# Altium footprint library LimeMicroAltiumLib_pcbLib_r01.PcbLib: 434 footprints (part 5 of 29)
Each footprint in its own frame and in the unit in brackets; x right, y up, seen from the top. Pads: shape width x height; smd on the part's side, far side on the other; paste and mask are expansions set on the pad; w line width, h text height; cw(c..) or ccw(c..) is an arc to the next point about the centre after c.
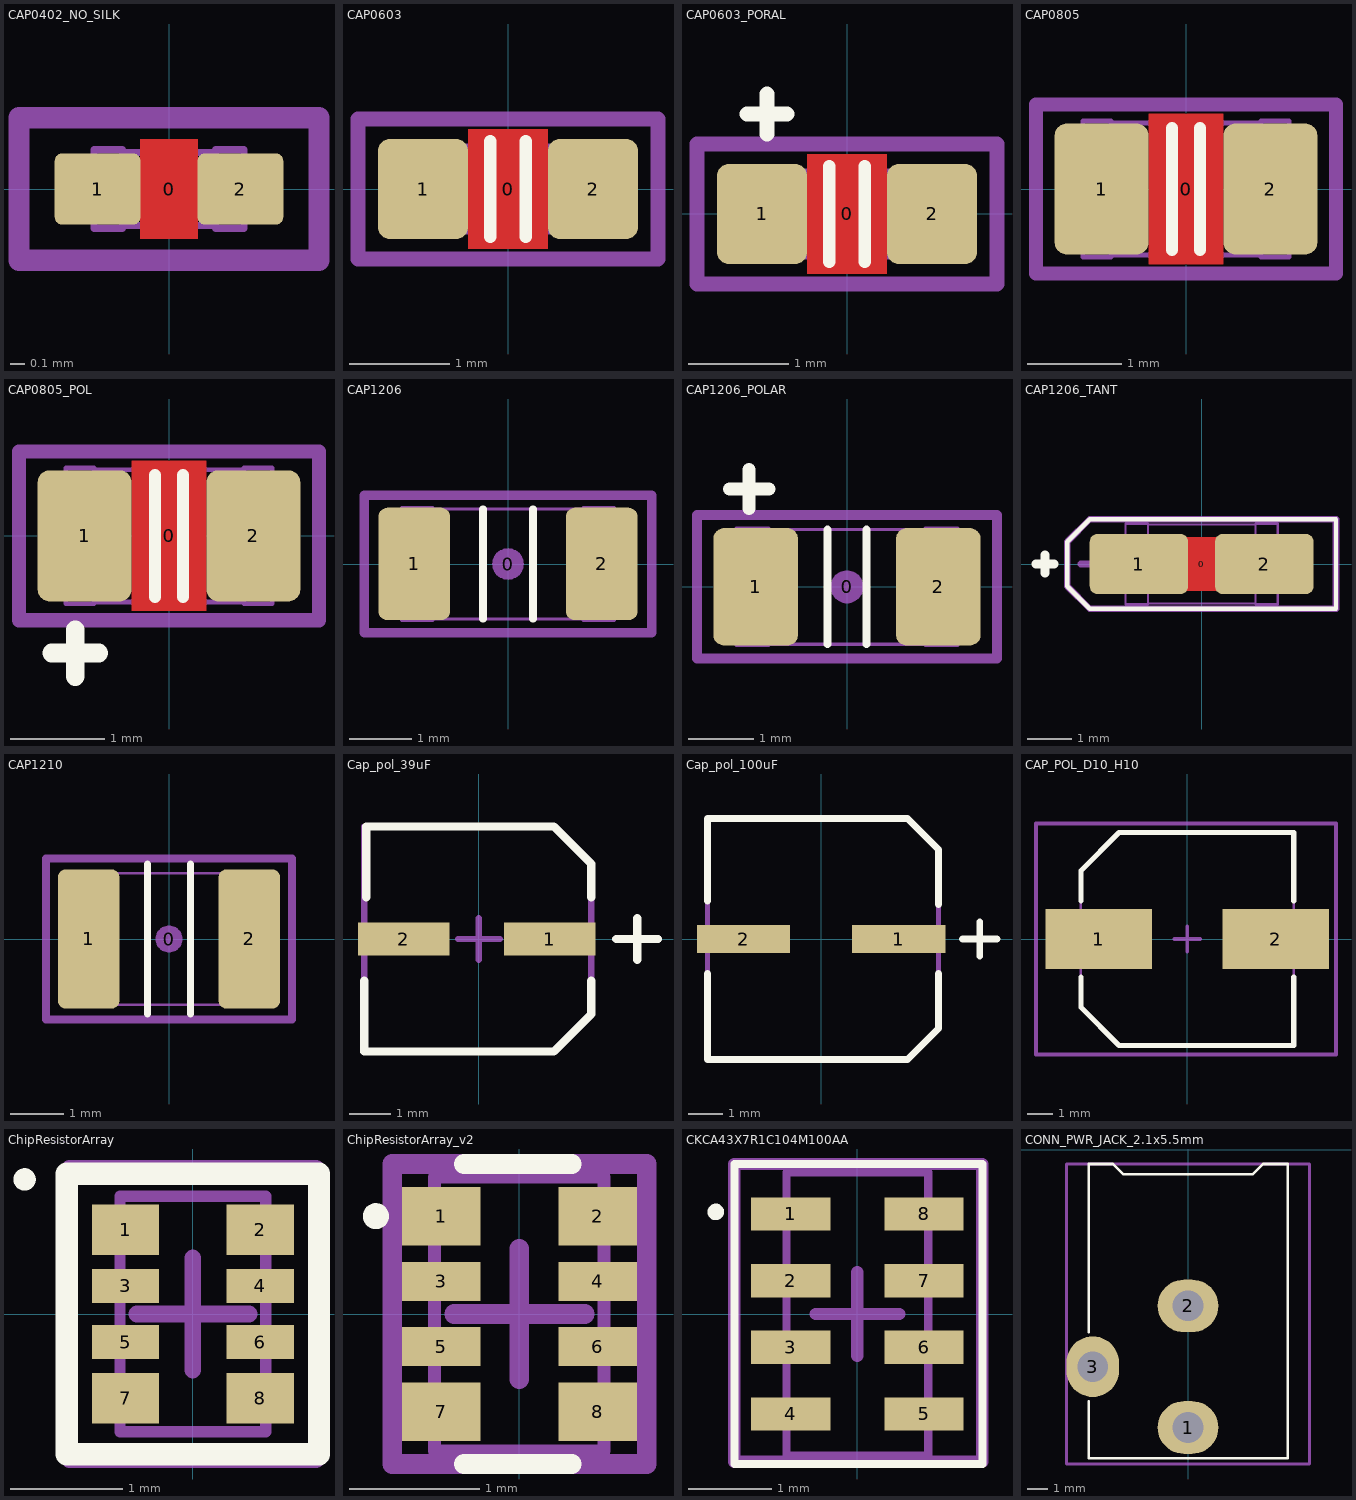
[diagram p4: the footprints below, top view; thin cyan lines are the x and y axes]

## CAP0402_NO_SILK [mm] "Chip Capacitor, Body 1.0x0.5mm, 0402, IPC Medium Density"
height 0.55
pads (3):
  round 0.2 on Mech15: 0(0,0)
  rrect20% 0.6x0.5 smd: 1(-0.5,0) 2(0.5,0)
Top Layer:
  pour cut-out: -0.2,0.35 0.2,0.35 0.2,-0.35 -0.2,-0.35
Mechanical 13:
  lines w0.05: -0.325,-0.255 0.325,-0.255 ; -0.325,0.255 0.325,0.255 ; -0.525,-0.275 -0.525,0.275 -0.325,0.275 -0.325,-0.275 -0.525,-0.275 ; 0.325,-0.275 0.525,-0.275 0.525,0.275 0.325,0.275 0.325,-0.275
Mechanical 15:
  lines w0.15: -1.05,-0.5 -1.05,0.5 1.05,0.5 1.05,-0.5 -1.05,-0.5
  text ".Designator" at 0,0 h0.55
3D body "CAP 0402 (1005 metric).STEP": height 0.55, standoff 0, extent -0.525,-0.275 0.525,0.275

## CAP0603 [mm] "Chip Capacitor, Body 1.6x0.8mm, 0603, IPC Medium Density"
height 0.8
pads (3):
  round 0.254 on Mech15: 0(0,0)
  rrect25% 0.9x1 smd: 1(-0.85,0) 2(0.85,0)
Top Layer:
  pour cut-out: -0.4,0.6 0.4,0.6 0.4,-0.6 -0.4,-0.6
Top Overlay:
  lines w0.127: -0.178,-0.476 -0.178,0.476 ; 0.178,-0.476 0.178,0.476
Mechanical 13:
  lines w0.05: -0.55,-0.43 0.55,-0.43 ; -0.55,0.43 0.55,0.43 ; -0.85,-0.45 -0.85,0.45 -0.55,0.45 -0.55,-0.45 -0.85,-0.45 ; 0.55,-0.45 0.55,0.45 0.85,0.45 0.85,-0.45 0.55,-0.45
Mechanical 15:
  lines w0.15: -1.5,-0.7 -1.5,0.7 1.5,0.7 1.5,-0.7 -1.5,-0.7
  text ".Designator" at 0,0 h0.55
3D body "CAP_0603.STEP": height 0.89, standoff -0.01, extent -0.85,-0.45 0.85,0.45

## CAP0603_PORAL [mm] "Chip Capacitor, Body 1.6x0.8mm, 0603, IPC Medium Density"
height 0.8
pads (3):
  round 0.254 on Mech15: 0(0,0)
  rrect25% 0.9x1 smd: 1(-0.85,0) 2(0.85,0)
Top Layer:
  pour cut-out: -0.4,0.6 0.4,0.6 0.4,-0.6 -0.4,-0.6
Top Overlay:
  lines w0.127: -0.178,-0.476 -0.178,0.476 ; 0.178,-0.476 0.178,0.476
  lines w0.15: -1,1 -0.6,1 ; -0.8,0.8 -0.8,1.2
Mechanical 13:
  lines w0.05: -0.55,-0.43 0.55,-0.43 ; -0.55,0.43 0.55,0.43 ; -0.85,-0.45 -0.85,0.45 -0.55,0.45 -0.55,-0.45 -0.85,-0.45 ; 0.55,-0.45 0.55,0.45 0.85,0.45 0.85,-0.45 0.55,-0.45
Mechanical 15:
  lines w0.15: -1.1,0 -0.7,0 ; -0.9,-0.2 -0.9,0.2 ; -1.5,-0.7 -1.5,0.7 1.5,0.7 1.5,-0.7 -1.5,-0.7
  text "Anode" at -1.4,-0.6 h0.3
  text ".Designator" at 0,0 h0.55
3D body "CAP_0603.STEP": height 0.89, standoff -0.01, extent -0.85,-0.45 0.85,0.45

## CAP0805 [mm] "Chip Capacitor, Body 2.0x1.2mm, 0805, IPC Medium Density"
height 1.2
pads (3):
  round 0.254 on Mech15: 0(0,0)
  rrect25% 1x1.4 smd: 1(-0.9,0) 2(0.9,0)
Top Layer:
  pour cut-out: -0.4,0.8 0.4,0.8 0.4,-0.8 -0.4,-0.8
Top Overlay:
  lines w0.127: -0.15,-0.651 -0.15,0.651 ; 0.15,-0.651 0.15,0.651
Mechanical 13:
  lines w0.05: -0.8,-0.705 0.8,-0.705 ; -0.8,0.705 0.8,0.705 ; -1.1,-0.725 -1.1,0.725 -0.8,0.725 -0.8,-0.725 -1.1,-0.725 ; 0.8,-0.725 1.1,-0.725 1.1,0.725 0.8,0.725 0.8,-0.725
Mechanical 15:
  lines w0.15: -1.6,-0.9 -1.6,0.9 1.6,0.9 1.6,-0.9 -1.6,-0.9
  text ".Designator" at 0,0 h0.55
3D body "CAP_0805.STEP": height 1.34, standoff -0.01, extent -1.1,-0.725 1.1,0.725

## CAP0805_POL [mm] "Chip Capacitor, Body 2.0x1.2mm, 0805, IPC Medium Density"
height 1.2
pads (3):
  round 0.254 on Mech15: 0(0,0)
  rrect25% 1x1.4 smd: 1(-0.9,0) 2(0.9,0)
Top Layer:
  pour cut-out: -0.4,0.8 0.4,0.8 0.4,-0.8 -0.4,-0.8
Top Overlay:
  lines w0.127: -0.15,-0.651 -0.15,0.651 ; 0.15,-0.651 0.15,0.651
  lines w0.2: -1.25,-1.25 -0.75,-1.25 ; -1,-1.5 -1,-1
Mechanical 13:
  lines w0.05: -0.8,-0.705 0.8,-0.705 ; -0.8,0.705 0.8,0.705 ; -1.1,-0.725 -0.8,-0.725 -0.8,0.725 -1.1,0.725 -1.1,-0.725 ; 0.8,-0.725 0.8,0.725 1.1,0.725 1.1,-0.725 0.8,-0.725
Mechanical 15:
  lines w0.15: -1.2,0 -0.7,0 ; -0.95,-0.25 -0.95,0.25 ; -1.6,-0.9 1.6,-0.9 1.6,0.9 -1.6,0.9 -1.6,-0.9
  text ".Designator" at 0,0 h0.55
3D body "CAP_0805.STEP": height 1.34, standoff -0.01, extent -1.1,-0.725 1.1,0.725

## CAP1206 [mm] "Chip Capacitor, Body 3.2x1.6mm, 1206, IPC Medium Density"
height 1.6
pads (3):
  round 0.508 on Mech15: 0(0,0)
  rrect25% 1.15x1.8 smd: 1(-1.5,0) 2(1.5,0)
Top Overlay:
  lines w0.127: -0.4,-0.876 -0.4,0.876 ; 0.4,-0.876 0.4,0.876
Mechanical 13:
  lines w0.05: -1.2,-0.88 1.2,-0.88 ; -1.2,0.88 1.2,0.88 ; -1.7,-0.9 -1.2,-0.9 -1.2,0.9 -1.7,0.9 -1.7,-0.9 ; 1.2,-0.9 1.7,-0.9 1.7,0.9 1.2,0.9 1.2,-0.9
Mechanical 15:
  lines w0.15: -2.3,-1.1 -2.3,1.1 2.3,1.1 2.3,-1.1 -2.3,-1.1
  text ".Designator" at 0,0 h0.55
3D body "CAP_1206.STEP": height 1.74, standoff -0.01, extent -1.7,-0.9 1.7,0.9

## CAP1206_POLAR [mm]
height 1.6
pads (3):
  round 0.508 on Mech15: 0(0,0)
  rrect25% 1.3x1.8 smd: 1(-1.4,0) 2(1.4,0)
Top Overlay:
  lines w0.127: -0.3,-0.876 -0.3,0.876 ; 0.3,-0.876 0.3,0.876
  lines w0.2: -1.8,1.5 -1.2,1.5 ; -1.5,1.2 -1.5,1.8
Mechanical 13:
  lines w0.05: -1.2,-0.88 1.2,-0.88 ; -1.2,0.88 1.2,0.88 ; -1.7,-0.9 -1.2,-0.9 -1.2,0.9 -1.7,0.9 -1.7,-0.9 ; 1.2,-0.9 1.7,-0.9 1.7,0.9 1.2,0.9 1.2,-0.9
Mechanical 15:
  lines w0.15: -1.6,0 -1.2,0 ; -1.4,-0.2 -1.4,0.2 ; -2.3,-1.1 -2.3,1.1 2.3,1.1 2.3,-1.1 -2.3,-1.1
  text "Anode" at -2,-0.8 h0.3
  text ".Designator" at 0,0 h0.55
3D body "User Library-CAP_TANT_3216-18_A_case-1.step": height 1.7, standoff 0, extent -1.7,-0.9 1.7,0.9

## CAP1206_TANT [mm] "Chip Capacitor, Body 1.6x0.8mm, 0603, IPC Medium Density"
height 0.8
pads (3):
  round 0.254 on Mech15: 0(0,0)
  rrect25% 2.2x1.35 smd: 1(-1.4,0) 2(1.4,0)
Top Layer:
  pour cut-out: -0.4,0.6 0.4,0.6 0.4,-0.6 -0.4,-0.6
Top Overlay:
  lines w0.1: -3,-0.5 -2.5,-1 3,-1 3,1 -2.5,1 -3,0.5 -3,-0.5
  lines w0.2: -3.7,0 -3.3,0 ; -3.5,-0.2 -3.5,0.2
Mechanical 13:
  lines w0.05: -1.2,-0.88 1.2,-0.88 ; -1.2,0.88 1.2,0.88 ; -1.7,-0.9 -1.2,-0.9 -1.2,0.9 -1.7,0.9 -1.7,-0.9 ; 1.2,-0.9 1.7,-0.9 1.7,0.9 1.2,0.9 1.2,-0.9
Mechanical 15:
  lines w0.15: -2.7,0 -1.7,0 ; -2.2,-0.5 -2.2,0.5 ; -3,-0.5 -3,0.5 -2.5,1 3,1 3,-1 -2.5,-1 -3,-0.5
  text ".Designator" at 0,0 h0.55
3D body "CAP_1206.STEP": height 1.74, standoff -0.01, extent -1.7,-0.9 1.7,0.9

## CAP1210 [mm] "Chip Capacitor, Body 3.2x2.5mm, 1210, IPC Medium Density"
height 1.6
pads (3):
  round 0.508 on Mech15: 0(0,0)
  rrect25% 1.15x2.6 smd: 1(-1.5,0) 2(1.5,0)
Top Overlay:
  lines w0.127: -0.4,-1.4 -0.4,1.4 ; 0.4,-1.4 0.4,1.4
Mechanical 13:
  lines w0.05: -1.2,-1.25 -1.6,-1.25 -1.6,1.25 -1.2,1.25 ; 1.2,-1.25 1.6,-1.25 1.6,1.25 1.2,1.25 ; -1.2,-1.23 -1.2,1.23 1.2,1.23 1.2,-1.23 -1.2,-1.23
Mechanical 15:
  lines w0.15: -2.3,-1.5 2.3,-1.5 2.3,1.5 -2.3,1.5 -2.3,-1.5
  text ".Designator" at 0,0 h0.55
3D body "User Library-CAPC3225X13.step": height 1.29, standoff -0.01, extent -1.6,-1.25 1.6,1.25

## Cap_pol_39uF [mm]
pads (2):
  rect 2.2x0.8 smd: 1(1.7,0) 2(-1.8,0)
Top Overlay:
  lines w0.2: -2.75,-1 -2.75,-2.7 1.8,-2.7 2.7,-1.8 2.7,-1 ; -2.7,1 -2.7,2.7 1.8,2.7 2.7,1.8 2.7,1 ; 3.3,0 4.3,0 ; 3.8,-0.5 3.8,0.5
Mechanical 15:
  lines w0.15: -0.5,0 0.5,0 ; 0,-0.5 0,0.5 ; 3.3,0 4.3,0 ; 3.8,-0.5 3.8,0.5 ; -2.75,-2.7 1.8,-2.7 2.7,-1.8 2.7,1.8 1.8,2.7 -2.75,2.7 -2.75,-2.7
  text ".Designator" at 0,0 h0.55
3D body: height 6, standoff 0, extent -2.232,-2.241 2.25,2.25
3D body: height 2, standoff 0, extent -2.65,-2.65 2.65,2.65

## Cap_pol_100uF [mm]
pads (2):
  rect 2.7x0.8 smd: 1(2.25,0) 2(-2.25,0)
Top Overlay:
  lines w0.2: -3.3,-1 -3.3,-3.5 2.5,-3.5 3.4,-2.6 3.4,-1 ; -3.3,1.1 -3.3,3.5 2.5,3.5 3.4,2.6 3.4,1 ; 4.1,0 5.1,0 ; 4.6,-0.5 4.6,0.5
Mechanical 15:
  lines w0.15: 4.1,0 5.1,0 ; 4.6,-0.5 4.6,0.5 ; -3.3,-3.5 -3.3,-1 -3.3,3.5 2.5,3.5 3.4,2.6 3.4,-2.6 2.5,-3.5 -3.3,-3.5
  text ".Designator" at 0,0 h0.55

## CAP_POL_D10_H10 [mm] "Aluminum Electrolytic Capacitor, Body 8,30x8,30x10,50mm, IPC Low Density"
height 10.5
pads (2):
  rect 4.15x2.35 smd: 1(-3.45,0) 2(3.45,0)
Top Overlay:
  lines w0.2: -4.15,-1.475 -4.15,-2.663 -2.663,-4.15 4.15,-4.15 4.15,-1.475 ; -4.15,1.475 -4.15,2.662 -2.663,4.15 4.15,4.15 4.15,1.475
Mechanical 13:
  lines w0.1: -4.15,-2.663 -2.663,-4.15 4.15,-4.15 4.15,4.15 -2.663,4.15 -4.15,2.662 -4.15,-2.663
Mechanical 15:
  lines w0.15: -0.5,0 0.5,0 ; 0,-0.5 0,0.5 ; -5.9,-4.5 -5.9,4.5 5.8,4.5 5.8,-4.5 -5.9,-4.5
  text ".Designator" at 0,0 h0.55
3D body: height 3.5, standoff 0, extent -4.15,-4.15 4.15,4.15
3D body: height 10.5, standoff 0, extent -4,-4 3.968,3.984

## ChipResistorArray [mm] "Chip Array, Flat, 8-Leads, Pitch 0,60mm,  Body 2,05x1,05mm,  IPC Medium Density"
height 0.5
pads (8):
  rect 0.6x0.45 smd mask+0.05: 1(-0.6,0.75) 2(0.6,0.75) 7(-0.6,-0.75) 8(0.6,-0.75)
  rect 0.6x0.3 smd mask+0.05: 3(-0.6,0.25) 4(0.6,0.25) 5(-0.6,-0.25) 6(0.6,-0.25)
Top Overlay:
  circle w0.1: c-1.5,1.2 r0.05
  lines w0.2: -1.125,-1.25 -1.125,1.25 1.125,1.25 1.125,-1.25 -1.125,-1.25
Mechanical 13:
  lines w0.1: -0.65,-1.05 -0.65,1.05 0.65,1.05 0.65,-1.05 -0.65,-1.05
Mechanical 15:
  lines w0.15: -0.5,0 0.5,0 ; 0,-0.5 0,0.5 ; -1.1,-1.3 -1.1,1.3 1.1,1.3 1.1,-1.3 -1.1,-1.3
  text ".Designator" at 0,0 h0.55
3D body "User Library-CAT10-103.STEP": height 0.4, standoff 0, extent -0.525,-1.025 0.475,0.975

## ChipResistorArray_v2 [mm] "Chip Array, Flat, 8-Leads, Pitch 0,60mm,  Body 2,05x1,05mm,  IPC Medium Density"
height 0.5
pads (8):
  rect 0.6x0.45 smd mask+0.01: 1(-0.6,0.75) 2(0.6,0.75) 7(-0.6,-0.75) 8(0.6,-0.75)
  rect 0.6x0.3 smd mask+0.01: 3(-0.6,0.25) 4(0.6,0.25) 5(-0.6,-0.25) 6(0.6,-0.25)
Top Overlay:
  circle w0.1: c-1.1,0.75 r0.05
  lines w0.15: -0.425,-1.15 0.4,-1.15 ; -0.425,1.15 0.4,1.15
Mechanical 13:
  lines w0.1: -0.65,-1.05 -0.65,1.05 0.65,1.05 0.65,-1.05 -0.65,-1.05
Mechanical 15:
  circle w0.1: c-0.6,0.75 r0.05
  lines w0.15: -0.5,0 0.5,0 ; 0,-0.5 0,0.5 ; -0.975,-1.15 -0.975,1.15 0.975,1.15 0.975,-1.15 -0.975,-1.15
  text ".Designator" at 0,0 h0.55
3D body "User Library-CAT10-103.STEP": height 0.4, standoff 0, extent -0.525,-1.025 0.475,0.975

## CKCA43X7R1C104M100AA [mm]
height 1
pads (8):
  rect 0.95x0.4 smd: 1(-0.8,1.2) 2(-0.8,0.4) 3(-0.8,-0.4) 4(-0.8,-1.2) 5(0.8,-1.2) 6(0.8,-0.4) 7(0.8,0.4) 8(0.8,1.2)
Top Overlay:
  circle w0.1: c-1.7,1.225 r0.05
  lines w0.1: -1.475,-1.8 -1.475,1.8 1.5,1.8 1.5,-1.8 -1.475,-1.8
Mechanical 13:
  lines w0.1: -0.85,-1.7 0.85,-1.7 0.85,1.7 -0.85,1.7 -0.85,-1.7
Mechanical 15:
  circle w0.35: c-1,1.2 r0
  lines w0.15: -0.5,0 0.5,0 ; 0,-0.5 0,0.5 ; -1.475,-1.775 1.5,-1.775 1.5,1.8 -1.475,1.8 -1.475,-1.775
  text ".Designator" at 0,0 h0.55
3D body "User Library-TC164.step": height 0.55, standoff 0, extent -0.8,-1.6 0.8,1.6

## CONN_PWR_JACK_2.1x5.5mm [mm] "Power Connector, 2.1mm ID, 5.5mm OD"
height 11
pads (3):
  oval 3x2.6 hole 1.511: 1(0,-13.7) 2(0,-7.7)
  oval 2.6x3 hole 1.511: 3(-4.7,-10.7)
Top Overlay:
  lines w0.127: -4.9,-12.4 -4.9,-15.225 4.925,-15.225 4.925,-0.7 3.7,-0.7 3.2,-1.2 -3.2,-1.2 -3.7,-0.7 -4.9,-0.7 -4.9,-9
Mechanical 13:
  lines w0.076: -4.9,-12.4 -4.9,-15.225 4.925,-15.225 4.925,-0.7 3.7,-0.7 3.2,-1.2 -3.2,-1.2 -3.7,-0.7 -4.9,-0.7 -4.9,-9
Mechanical 15:
  lines w0.15: -6,-15.5 6,-15.5 6,-0.7 -6,-0.7 -6,-15.5
  text ".Designator" at 0,-7.7 h0.55
3D body "3100-522 Connector.stp": height 11, standoff -3.5, extent -4.9,-14.1 4.5,0